# Altium footprint library mastermind.PCBLIB: 1061 footprints (part 63 of 67)
Each footprint in its own frame and in the unit in brackets; x right, y up, seen from the top. Pads: shape width x height; smd on the part's side, far side on the other; paste and mask are expansions set on the pad; w line width, h text height; cw(c..) or ccw(c..) is an arc to the next point about the centre after c.
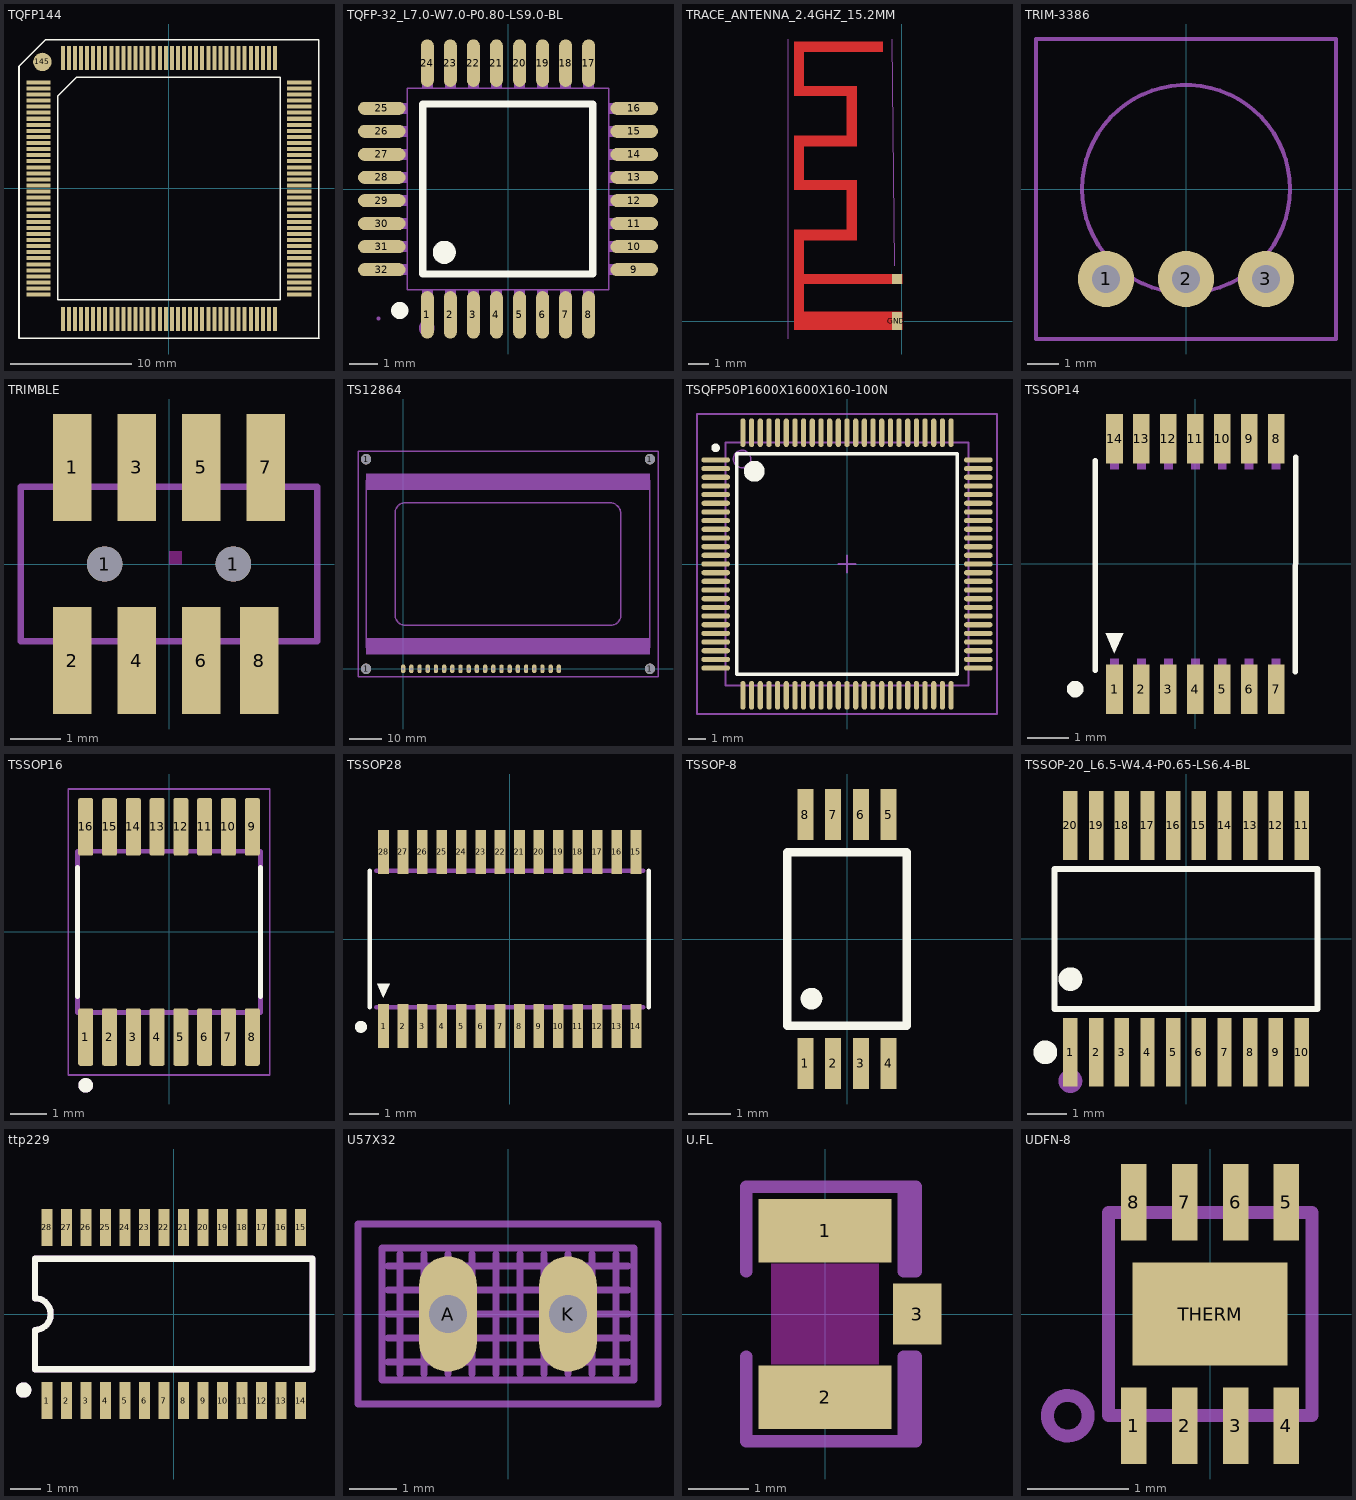
[diagram p62: the footprints below, top view; thin cyan lines are the x and y axes]

## TQFP144 [mm]
pads (145):
  rect 2x0.33 smd: 1(-10.75,8.75) 2(-10.75,8.25) 3(-10.75,7.75) 4(-10.75,7.25) 5(-10.75,6.75) 6(-10.75,6.25) 7(-10.75,5.75) 8(-10.75,5.25) 9(-10.75,4.75) 10(-10.75,4.25) 11(-10.75,3.75) 12(-10.75,3.25) 13(-10.75,2.75) 14(-10.75,2.25) 15(-10.75,1.75) 16(-10.75,1.25) 17(-10.75,0.75) 18(-10.75,0.25) 19(-10.75,-0.25) 20(-10.75,-0.75) 21(-10.75,-1.25) 22(-10.75,-1.75) 23(-10.75,-2.25) 24(-10.75,-2.75) 25(-10.75,-3.25) 26(-10.75,-3.75) 27(-10.75,-4.25) 28(-10.75,-4.75) 29(-10.75,-5.25) 30(-10.75,-5.75) 31(-10.75,-6.25) 32(-10.75,-6.75) 33(-10.75,-7.25) 34(-10.75,-7.75) 35(-10.75,-8.25) 36(-10.75,-8.75) 73(10.75,-8.75) 74(10.75,-8.25) 75(10.75,-7.75) 76(10.75,-7.25) 77(10.75,-6.75) 78(10.75,-6.25) 79(10.75,-5.75) 80(10.75,-5.25) 81(10.75,-4.75) 82(10.75,-4.25) 83(10.75,-3.75) 84(10.75,-3.25) 85(10.75,-2.75) 86(10.75,-2.25) 87(10.75,-1.75) 88(10.75,-1.25) 89(10.75,-0.75) 90(10.75,-0.25) 91(10.75,0.25) 92(10.75,0.75) 93(10.75,1.25) 94(10.75,1.75) 95(10.75,2.25) 96(10.75,2.75) 97(10.75,3.25) 98(10.75,3.75) 99(10.75,4.25) 100(10.75,4.75) 101(10.75,5.25) 102(10.75,5.75) 103(10.75,6.25) 104(10.75,6.75) 105(10.75,7.25) 106(10.75,7.75) 107(10.75,8.25) 108(10.75,8.75)
  rect 0.33x2 smd: 37(-8.75,-10.75) 38(-8.25,-10.75) 39(-7.75,-10.75) 40(-7.25,-10.75) 41(-6.75,-10.75) 42(-6.25,-10.75) 43(-5.75,-10.75) 44(-5.25,-10.75) 45(-4.75,-10.75) 46(-4.25,-10.75) 47(-3.75,-10.75) 48(-3.25,-10.75) 49(-2.75,-10.75) 50(-2.25,-10.75) 51(-1.75,-10.75) 52(-1.25,-10.75) 53(-0.75,-10.75) 54(-0.25,-10.75) 55(0.25,-10.75) 56(0.75,-10.75) 57(1.25,-10.75) 58(1.75,-10.75) 59(2.25,-10.75) 60(2.75,-10.75) 61(3.25,-10.75) 62(3.75,-10.75) 63(4.25,-10.75) 64(4.75,-10.75) 65(5.25,-10.75) 66(5.75,-10.75) 67(6.25,-10.75) 68(6.75,-10.75) 69(7.25,-10.75) 70(7.75,-10.75) 71(8.25,-10.75) 72(8.75,-10.75) 109(8.75,10.75) 110(8.25,10.75) 111(7.75,10.75) 112(7.25,10.75) 113(6.75,10.75) 114(6.25,10.75) 115(5.75,10.75) 116(5.25,10.75) 117(4.75,10.75) 118(4.25,10.75) 119(3.75,10.75) 120(3.25,10.75) 121(2.75,10.75) 122(2.25,10.75) 123(1.75,10.75) 124(1.25,10.75) 125(0.75,10.75) 126(0.25,10.75) 127(-0.25,10.75) 128(-0.75,10.75) 129(-1.25,10.75) 130(-1.75,10.75) 131(-2.25,10.75) 132(-2.75,10.75) 133(-3.25,10.75) 134(-3.75,10.75) 135(-4.25,10.75) 136(-4.75,10.75) 137(-5.25,10.75) 138(-5.75,10.75) 139(-6.25,10.75) 140(-6.75,10.75) 141(-7.25,10.75) 142(-7.75,10.75) 143(-8.25,10.75) 144(-8.75,10.75)
  round 1.524 smd: 145(-10.432,10.432)
Top Overlay:
  lines w0.127: -9.177,12.271 12.354,12.271 12.354,-12.333 ; -8.895,12.271 -10.172,12.271 -12.358,10.085 -12.358,-12.354 12.376,-12.354 ; -9.178,-9.178 9.178,-9.178 9.178,9.178 -7.607,9.178 -9.178,7.607 -9.178,-9.178
3D body "QFP50P2200X2200X160-144N LQFP-144.stp": height 1.6, standoff 0, extent -10.988,-11.075 11.012,10.925

## TQFP-32_L7.0-W7.0-P0.80-LS9.0-BL [mm]
pads (32):
  oval 0.45x1.65 smd paste+0 mask+0.051: 1(-2.8,-4.369) 2(-2,-4.369) 3(-1.2,-4.369) 4(-0.4,-4.369) 5(0.4,-4.369) 6(1.2,-4.369) 7(2,-4.369) 8(2.8,-4.369) 17(2.8,4.369) 18(2,4.369) 19(1.2,4.369) 20(0.4,4.369) 21(-0.4,4.369) 22(-1.2,4.369) 23(-2,4.369) 24(-2.8,4.369)
  oval 1.65x0.45 smd paste+0 mask+0.051: 9(4.381,-2.8) 10(4.381,-2) 11(4.381,-1.2) 12(4.381,-0.4) 13(4.381,0.4) 14(4.381,1.2) 15(4.381,2) 16(4.381,2.8) 25(-4.381,2.8) 26(-4.381,2) 27(-4.381,1.2) 28(-4.381,0.4) 29(-4.381,-0.4) 30(-4.381,-1.2) 31(-4.381,-2) 32(-4.381,-2.8)
Top Overlay:
  lines w0.254: -2.963,-2.95 2.937,-2.95 2.937,2.95 -2.963,2.95 -2.963,-2.95
  lines w0.3: -3.759,-4.064 ccw(c-3.758,-4.214) -3.757,-4.064
  lines w0.4: -2.212,-1.999 ccw(c-2.211,-2.199) -2.21,-1.999
Mechanical 6:
  circle w0.254: c-2.819,-4.826 r0.127
  lines w0.254: -2.967,-4.826 ccw(c-2.819,-4.826) -2.671,-4.826 ccw(c-2.819,-4.826) -2.967,-4.826
Mechanical 15:
  drawing of 69 lines, arcs and shapes, not listed
3D body "User Library-TQFP-32.STEP": height 1.46, standoff 0, extent -4.405,-4.529 4.595,4.471

## TRACE_ANTENNA_2.4GHZ_15.2MM [mm]
pads (2):
  rect 0.5x0.5 smd paste+0 mask+0: ANT(-0.25,2.1)
  rect 0.5x0.9 smd paste+0 mask+0: GND(-0.25,0)
Top Layer:
  region: 0,1.85 -4.9,1.85 -4.9,0.45 0,0.45 0,-0.45 -5.4,-0.45 -5.4,4.55 -2.76,4.55 -2.76,6.55 -5.4,6.55 -5.4,9.25 -2.76,9.25 -2.76,11.25 -5.4,11.25 -5.4,13.95 -0.96,13.95 -0.96,13.45 -4.9,13.45 -4.9,11.75 -2.26,11.75 -2.26,8.75 -4.9,8.75 -4.9,7.05 -2.26,7.05 -2.26,4.05 -4.9,4.05 -4.9,2.35 0,2.35
Mechanical 3:
  lines w0.05: -5.7,-0.9 -5.7,14.1 ; -0.5,14.1 -0.39,2.773
  text "Ground Plane" at 0.3,3.1 h0.54

## TRIM-3386 [mil]
pads (3):
  round 70 hole 35.43: 1(-100,-112.5) 2(0,-112.5) 3(100,-112.5)
Mechanical 2:
  circle w5: c0,0 r130
  lines w5: -187.5,-187.5 187.5,-187.5 187.5,187.5 -187.5,187.5 -187.5,-187.5

## TRIMBLE [mil]
pads (10):
  rect 30x83 smd: 1(-75,75) 2(-75,-75) 3(-25,75) 4(-25,-75) 5(25,75) 6(25,-75) 7(75,75) 8(70,-75)
  round 27.56 hole 27.56: 1(-50,0) 1(50,0)
Top Layer keep-out:
  region: 0,0 10,0 10,10 0,10
Mechanical 2:
  lines w5: -115,-60 115,-60 115,60 -115,60 -115,-60

## TS12864 [mm]
pads (24):
  round 3.2 hole 3.2: 1(-11.5,0) 1(-11.5,65) 1(76.5,0) 1(76.5,65)
  oval 1.35x2.7 hole 0.9: 1(48.26,0) 2(45.72,0) 3(43.18,0) 4(40.64,0) 5(38.1,0) 6(35.56,0) 7(33.02,0) 8(30.48,0) 9(27.94,0) 10(25.4,0) 11(22.86,0) 12(20.32,0) 13(17.78,0) 14(15.24,0) 15(12.7,0) 16(10.16,0) 17(7.62,0) 18(5.08,0) 19(2.54,0) 20(0,0)
Mechanical 8:
  lines w0.406: -7.5,9 72.5,9 ; -7.5,56 72.5,56 ; -14,-2.5 79,-2.5 79,67.5 -14,67.5 -14,-2.5 ; -11.5,6.5 76.5,6.5 76.5,58.5 -11.5,58.5 -11.5,6.5 ; -2.5,16.702 ccw(c0.701,16.702) 0.702,13.5 64.299,13.5 ccw(c64.299,16.702) 67.5,16.702 67.5,47.965 ccw(c63.965,47.965) 63.965,51.5 0.702,51.5 ccw(c0.701,48.298) -2.5,48.299 -2.5,16.702
Mechanical 29 (Mech34):
  region: -11.5,55.5 -11.5,60.5 76.5,60.5 76.5,55.5
  region: -11.5,4.5 -11.5,9.5 76.5,9.5 76.5,4.5

## TSQFP50P1600X1600X160-100N [mm]
pads (100):
  oval 1.65x0.3 smd: 1(-7.575,6) 2(-7.575,5.5) 3(-7.575,5) 4(-7.575,4.5) 5(-7.575,4) 6(-7.575,3.5) 7(-7.575,3) 8(-7.575,2.5) 9(-7.575,2) 10(-7.575,1.5) 11(-7.575,1) 12(-7.575,0.5) 13(-7.575,0) 14(-7.575,-0.5) 15(-7.575,-1) 16(-7.575,-1.5) 17(-7.575,-2) 18(-7.575,-2.5) 19(-7.575,-3) 20(-7.575,-3.5) 21(-7.575,-4) 22(-7.575,-4.5) 23(-7.575,-5) 24(-7.575,-5.5) 25(-7.575,-6) 51(7.575,-6) 52(7.575,-5.5) 53(7.575,-5) 54(7.575,-4.5) 55(7.575,-4) 56(7.575,-3.5) 57(7.575,-3) 58(7.575,-2.5) 59(7.575,-2) 60(7.575,-1.5) 61(7.575,-1) 62(7.575,-0.5) 63(7.575,0) 64(7.575,0.5) 65(7.575,1) 66(7.575,1.5) 67(7.575,2) 68(7.575,2.5) 69(7.575,3) 70(7.575,3.5) 71(7.575,4) 72(7.575,4.5) 73(7.575,5) 74(7.575,5.5) 75(7.575,6)
  oval 0.3x1.65 smd: 26(-6,-7.575) 27(-5.5,-7.575) 28(-5,-7.575) 29(-4.5,-7.575) 30(-4,-7.575) 31(-3.5,-7.575) 32(-3,-7.575) 33(-2.5,-7.575) 34(-2,-7.575) 35(-1.5,-7.575) 36(-1,-7.575) 37(-0.5,-7.575) 38(0,-7.575) 39(0.5,-7.575) 40(1,-7.575) 41(1.5,-7.575) 42(2,-7.575) 43(2.5,-7.575) 44(3,-7.575) 45(3.5,-7.575) 46(4,-7.575) 47(4.5,-7.575) 48(5,-7.575) 49(5.5,-7.575) 50(6,-7.575) 76(6,7.575) 77(5.5,7.575) 78(5,7.575) 79(4.5,7.575) 80(4,7.575) 81(3.5,7.575) 82(3,7.575) 83(2.5,7.575) 84(2,7.575) 85(1.5,7.575) 86(1,7.575) 87(0.5,7.575) 88(0,7.575) 89(-0.5,7.575) 90(-1,7.575) 91(-1.5,7.575) 92(-2,7.575) 93(-2.5,7.575) 94(-3,7.575) 95(-3.5,7.575) 96(-4,7.575) 97(-4.5,7.575) 98(-5,7.575) 99(-5.5,7.575) 100(-6,7.575)
Top Overlay:
  circle w0.6: c-5.35,5.35 r0.3
  circle w0.25: c-7.575,6.7 r0.125
  lines w0.2: -6.35,-6.35 6.35,-6.35 6.35,6.35 -6.35,6.35 -6.35,-6.35
Mechanical 13:
  circle w0.1: c-6.05,6.05 r0.5
  lines w0.1: -7,-7 7,-7 7,7 -7,7 -7,-7
Mechanical 15:
  lines w0.1: -0.5,0 0.5,0 ; 0,-0.5 0,0.5 ; -8.65,-8.65 8.65,-8.65 8.65,8.65 -8.65,8.65 -8.65,-8.65
3D body "User Library-LQFP-100 (2).step": height 1.6, standoff 0, extent -8.001,-8 7.999,8

## TSSOP14 [mm]
pads (14):
  rect 0.4x1.2 smd: 1(-1.95,-3.019) 2(-1.3,-3.019) 3(-0.65,-3.019) 4(0,-3.019) 5(0.65,-3.019) 6(1.3,-3.019) 7(1.95,-3.019) 8(1.95,3.019) 9(1.3,3.019) 10(0.65,3.019) 11(0,3.019) 12(-0.65,3.019) 13(-1.3,3.019) 14(-1.95,3.019)
Top Overlay:
  circle w0.203: c-2.9,-3.019 r0.1
  region: -2.162,-1.676 -1.738,-1.676 -1.959,-2.153
  lines w0.127: -2.416,-2.565 -2.416,-0.497 -2.416,0.497 -2.416,2.489 ; 2.413,-2.603 2.426,2.578
Mechanical 8:
  region: -2.052,-3.121 -2.052,-2.283 -1.848,-2.283 -1.848,-3.121
  region: -1.402,-3.121 -1.402,-2.283 -1.198,-2.283 -1.198,-3.121
  region: -0.752,-3.121 -0.752,-2.283 -0.548,-2.283 -0.548,-3.121
  region: -0.102,-3.121 -0.102,-2.283 0.102,-2.283 0.102,-3.121
  region: 0.548,-3.121 0.548,-2.283 0.752,-2.283 0.752,-3.121
  region: 1.198,-3.121 1.198,-2.283 1.402,-2.283 1.402,-3.121
  region: 1.848,-3.121 1.848,-2.283 2.052,-2.283 2.052,-3.121
  region: 1.848,2.283 1.848,3.121 2.052,3.121 2.052,2.283
  region: 1.198,2.283 1.198,3.121 1.402,3.121 1.402,2.283
  region: 0.548,2.283 0.548,3.121 0.752,3.121 0.752,2.283
  region: -0.102,2.283 -0.102,3.121 0.102,3.121 0.102,2.283
  region: -0.752,2.283 -0.752,3.121 -0.548,3.121 -0.548,2.283
  region: -1.402,2.283 -1.402,3.121 -1.198,3.121 -1.198,2.283
  region: -2.052,2.283 -2.052,3.121 -1.848,3.121 -1.848,2.283
3D body "TSSOP-14.stp": height 1.11, standoff 0.01, extent -2.225,-3.215 2.225,3.216

## TSSOP16 [mm]
pads (16):
  rrect25% 0.41x1.57 smd: 1(-2.275,-2.87) 2(-1.625,-2.87) 3(-0.975,-2.87) 4(-0.325,-2.87) 5(0.325,-2.87) 6(0.975,-2.87) 7(1.625,-2.87) 8(2.275,-2.87) 9(2.275,2.87) 10(1.625,2.87) 11(0.975,2.87) 12(0.325,2.87) 13(-0.325,2.87) 14(-0.975,2.87) 15(-1.625,2.87) 16(-2.275,2.87)
Top Overlay:
  circle w0.2: c-2.275,-4.19 r0.1
  lines w0.127: -2.5,-1.765 -2.5,1.765 ; 2.5,-1.765 2.5,1.765
Mechanical 13:
  circle w0.2: c-2.275,-4.19 r0.1
  lines w0.127: -2.5,-2.2 -2.5,2.2 2.5,2.2 2.5,-2.2 -2.5,-2.2
Mechanical 15:
  lines w0.05: -2.75,-3.905 -2.75,3.905 2.75,3.905 2.75,-3.905 -2.75,-3.905
3D body "TSSOP-16.stp": height 1.11, standoff 0.01, extent -2.549,-3.215 2.549,3.215

## TSSOP28 [mm]
pads (28):
  rect 0.356x1.473 smd: 1(-4.225,-2.918) 2(-3.575,-2.918) 3(-2.925,-2.918) 4(-2.275,-2.918) 5(-1.625,-2.918) 6(-0.975,-2.918) 7(-0.325,-2.918) 8(0.325,-2.918) 9(0.975,-2.918) 10(1.625,-2.918) 11(2.275,-2.918) 12(2.925,-2.918) 13(3.575,-2.918) 14(4.225,-2.918) 15(4.225,2.918) 16(3.575,2.918) 17(2.925,2.918) 18(2.275,2.918) 19(1.625,2.918) 20(0.975,2.918) 21(0.325,2.918) 22(-0.325,2.918) 23(-0.975,2.918) 24(-1.625,2.918) 25(-2.275,2.918) 26(-2.925,2.918) 27(-3.575,2.918) 28(-4.225,2.918)
Top Overlay:
  circle w0.203: c-4.98,-2.94 r0.1
  region: -4.433,-1.497 -4.01,-1.497 -4.23,-1.974
  lines w0.152: -4.685,-2.283 -4.685,2.283 ; 4.655,-2.283 4.655,2.283
Mechanical 8:
  region: -4.327,-3.121 -4.327,-2.283 -4.123,-2.283 -4.123,-3.121
  region: -3.677,-3.121 -3.677,-2.283 -3.473,-2.283 -3.473,-3.121
  region: -3.027,-3.121 -3.027,-2.283 -2.823,-2.283 -2.823,-3.121
  region: -2.377,-3.121 -2.377,-2.283 -2.173,-2.283 -2.173,-3.121
  region: -1.727,-3.121 -1.727,-2.283 -1.523,-2.283 -1.523,-3.121
  region: -1.077,-3.121 -1.077,-2.283 -0.874,-2.283 -0.874,-3.121
  region: -0.427,-3.121 -0.427,-2.283 -0.224,-2.283 -0.224,-3.121
  region: 0.224,-3.121 0.224,-2.283 0.427,-2.283 0.427,-3.121
  region: 0.224,2.283 0.224,3.121 0.427,3.121 0.427,2.283
  region: -0.427,2.283 -0.427,3.121 -0.224,3.121 -0.224,2.283
  region: -1.077,2.283 -1.077,3.121 -0.874,3.121 -0.874,2.283
  region: -1.727,2.283 -1.727,3.121 -1.523,3.121 -1.523,2.283
  region: -2.377,2.283 -2.377,3.121 -2.173,3.121 -2.173,2.283
  region: -3.027,2.283 -3.027,3.121 -2.823,3.121 -2.823,2.283
  region: -3.677,2.283 -3.677,3.121 -3.473,3.121 -3.473,2.283
  region: -4.327,2.283 -4.327,3.121 -4.123,3.121 -4.123,2.283
  region: 0.874,-3.121 0.874,-2.283 1.077,-2.283 1.077,-3.121
  region: 1.523,-3.121 1.523,-2.283 1.727,-2.283 1.727,-3.121
  region: 0.874,2.283 0.874,3.121 1.077,3.121 1.077,2.283
  region: 1.523,2.283 1.523,3.121 1.727,3.121 1.727,2.283
  region: 2.173,-3.121 2.173,-2.283 2.377,-2.283 2.377,-3.121
  region: 2.823,-3.121 2.823,-2.283 3.027,-2.283 3.027,-3.121
  region: 3.473,-3.121 3.473,-2.283 3.677,-2.283 3.677,-3.121
  region: 4.123,-3.121 4.123,-2.283 4.327,-2.283 4.327,-3.121
  region: 4.123,2.283 4.123,3.121 4.327,3.121 4.327,2.283
  region: 3.473,2.283 3.473,3.121 3.677,3.121 3.677,2.283
  region: 2.823,2.283 2.823,3.121 3.027,3.121 3.027,2.283
  region: 2.173,2.283 2.173,3.121 2.377,3.121 2.377,2.283
  lines w0.152: -4.465,-2.283 4.465,-2.283 ; -4.465,2.283 4.465,2.283
3D body "TSSOP-28.stp": height 1.11, standoff 0.01, extent -4.5,-3.215 4.5,3.215

## TSSOP-8 [mm]
pads (8):
  rect 0.38x1.2 smd mask+0.13: 1(-0.975,-2.913) 2(-0.325,-2.913) 3(0.325,-2.913) 4(0.975,-2.913) 5(0.975,2.913) 6(0.325,2.913) 7(-0.325,2.913) 8(-0.975,2.913)
Top Overlay:
  circle w0.254: c-0.832,-1.397 r0.127
  lines w0.203: -1.4,-2.032 -1.4,2.032 -0.832,2.032 1.4,2.032 1.4,-2.032 -1.4,-2.032
3D body "TSSOP-08.stp": height 1.11, standoff 0.01, extent -1.249,-3.215 1.249,3.215

## TSSOP-20_L6.5-W4.4-P0.65-LS6.4-BL [mm]
pads (20):
  rect 0.364x1.742 smd paste+0 mask+0.051: 1(-2.925,-2.871) 2(-2.275,-2.871) 3(-1.625,-2.871) 4(-0.975,-2.871) 5(-0.325,-2.871) 6(0.325,-2.871) 7(0.975,-2.871) 8(1.625,-2.871) 9(2.275,-2.871) 10(2.925,-2.871) 11(2.925,2.871) 12(2.275,2.871) 13(1.625,2.871) 14(0.975,2.871) 15(0.325,2.871) 16(-0.325,2.871) 17(-0.975,2.871) 18(-1.625,2.871) 19(-2.275,2.871) 20(-2.925,2.871)
Top Overlay:
  circle w0.3: c-3.559,-2.871 r0.15
  circle w0.3: c-2.925,-1.019 r0.15
  lines w0.152: -3.326,-1.771 3.326,-1.771 3.326,1.771 -3.326,1.771 -3.326,-1.771
Mechanical 15:
  circle w0.3: c-2.925,-3.6 r0.15
3D body "TSSOP-20.stp": height 1.11, standoff 0.01, extent -3.217,-3.277 3.181,3.153

## ttp229 [mm]
pads (28):
  rect 0.35x1.2 smd: 1(-4.131,-2.819) 2(-3.495,-2.819) 3(-2.86,-2.819) 4(-2.224,-2.819) 5(-1.589,-2.819) 6(-0.953,-2.819) 7(-0.318,-2.819) 8(0.318,-2.819) 9(0.953,-2.819) 10(1.589,-2.819) 11(2.224,-2.819) 12(2.86,-2.819) 13(3.495,-2.819) 14(4.131,-2.819) 15(4.131,2.819) 16(3.495,2.819) 17(2.86,2.819) 18(2.224,2.819) 19(1.589,2.819) 20(0.953,2.819) 21(0.318,2.819) 22(-0.318,2.819) 23(-0.953,2.819) 24(-1.589,2.819) 25(-2.224,2.819) 26(-2.86,2.819) 27(-3.495,2.819) 28(-4.131,2.819)
Top Overlay:
  circle w0.25: c-4.889,-2.476 r0.125
  lines w0.2: -4.523,1.791 -4.523,0.514 cw(c-4.523,-0.003) -4.523,-0.519 -4.523,-1.791 -4.514,-1.8 4.514,-1.8 4.523,-1.791 4.523,1.791 ; -4.523,1.8 4.523,1.8
Mechanical 29:
  circle w0.25: c-4.889,-2.476 r0.125
  lines w0.2: -4.523,1.791 -4.523,0.514 cw(c-4.523,-0.003) -4.523,-0.519 -4.523,-1.791 -4.514,-1.8 4.514,-1.8 4.523,-1.791 4.523,1.791 ; -4.523,1.8 4.523,1.8
  text ".Designator" at -1.219,-0.318 h1

## U57X32 [mil]
pads (2):
  oval 48x96 hole 32: A(-50,0) K(50,0)
Mechanical 2:
  lines w6: -125,-75 125,-75 125,75 -125,75 -125,-75 ; -105,-55 105,-55 105,55 -105,55 -105,-55
Mechanical 8:
  lines w6: -100,-40 100,-40 ; -100,-20 100,-20 ; -100,0 100,0 ; -100,20 100,20 ; -100,40 100,40 ; -90,-50 -90,50 ; -70,-50 -70,50 ; -50,-50 -50,50 ; -30,-50 -30,50 ; -10,-50 -10,50 ; 10,-50 10,50 ; 30,-50 30,50 ; 50,-50 50,50 ; 70,-50 70,50 ; 90,-50 90,50

## U.FL [mm]
pads (3):
  rect 2.2x1.05 smd: 1(0,1.375) 2(0,-1.375)
  rect 0.8x1 smd: 3(1.525,0)
Top Layer keep-out:
  region: -0.889,-0.826 -0.889,0.826 0.889,0.826 0.889,-0.826
Mechanical 2:
  lines w0.203: -1.3,-0.7 -1.3,-2.1 1.3,-2.1 ; -1.3,0.7 -1.3,2.1 1.3,2.1 ; 1.4,-2 1.4,-0.7 ; 1.4,0.7 1.4,2 ; 1.3,-2.1 1.3,-0.7 1.5,-0.7 1.5,-2.1 1.3,-2.1 ; 1.3,2.1 1.3,0.7 1.5,0.7 1.5,2.1 1.3,2.1

## UDFN-8 [mil]
pads (9):
  rect 9.84x29.53 smd: 1(-29.53,-43.31) 2(-9.84,-43.31) 3(9.84,-43.31) 4(29.53,-43.31) 5(29.53,43.31) 6(9.84,43.31) 7(-9.84,43.31) 8(-29.53,43.31)
  rect 60x40 smd paste-30 mask-30: THERM(0,0)
Top Paste:
  region: 0,0 10,0 10,10 0,10
  region: 0,0 10,0 10,10 0,10
  region: 0,0 10,0 10,10 0,10
  region: 0,0 10,0 10,10 0,10
Top Solder:
  region: 0,0 10,0 10,10 0,10
Mechanical 2:
  circle w5: c-55.12,-39.37 r7.87
  lines w5: -39.37,-39.37 39.37,-39.37 39.37,39.37 -39.37,39.37 -39.37,-39.37